# Altium footprint library Connectors.PcbLib: 63 footprints (part 2 of 4)
Each footprint in its own frame and in the unit in brackets; x right, y up, seen from the top. Pads: shape width x height; smd on the part's side, far side on the other; paste and mask are expansions set on the pad; w line width, h text height; cw(c..) or ccw(c..) is an arc to the next point about the centre after c.
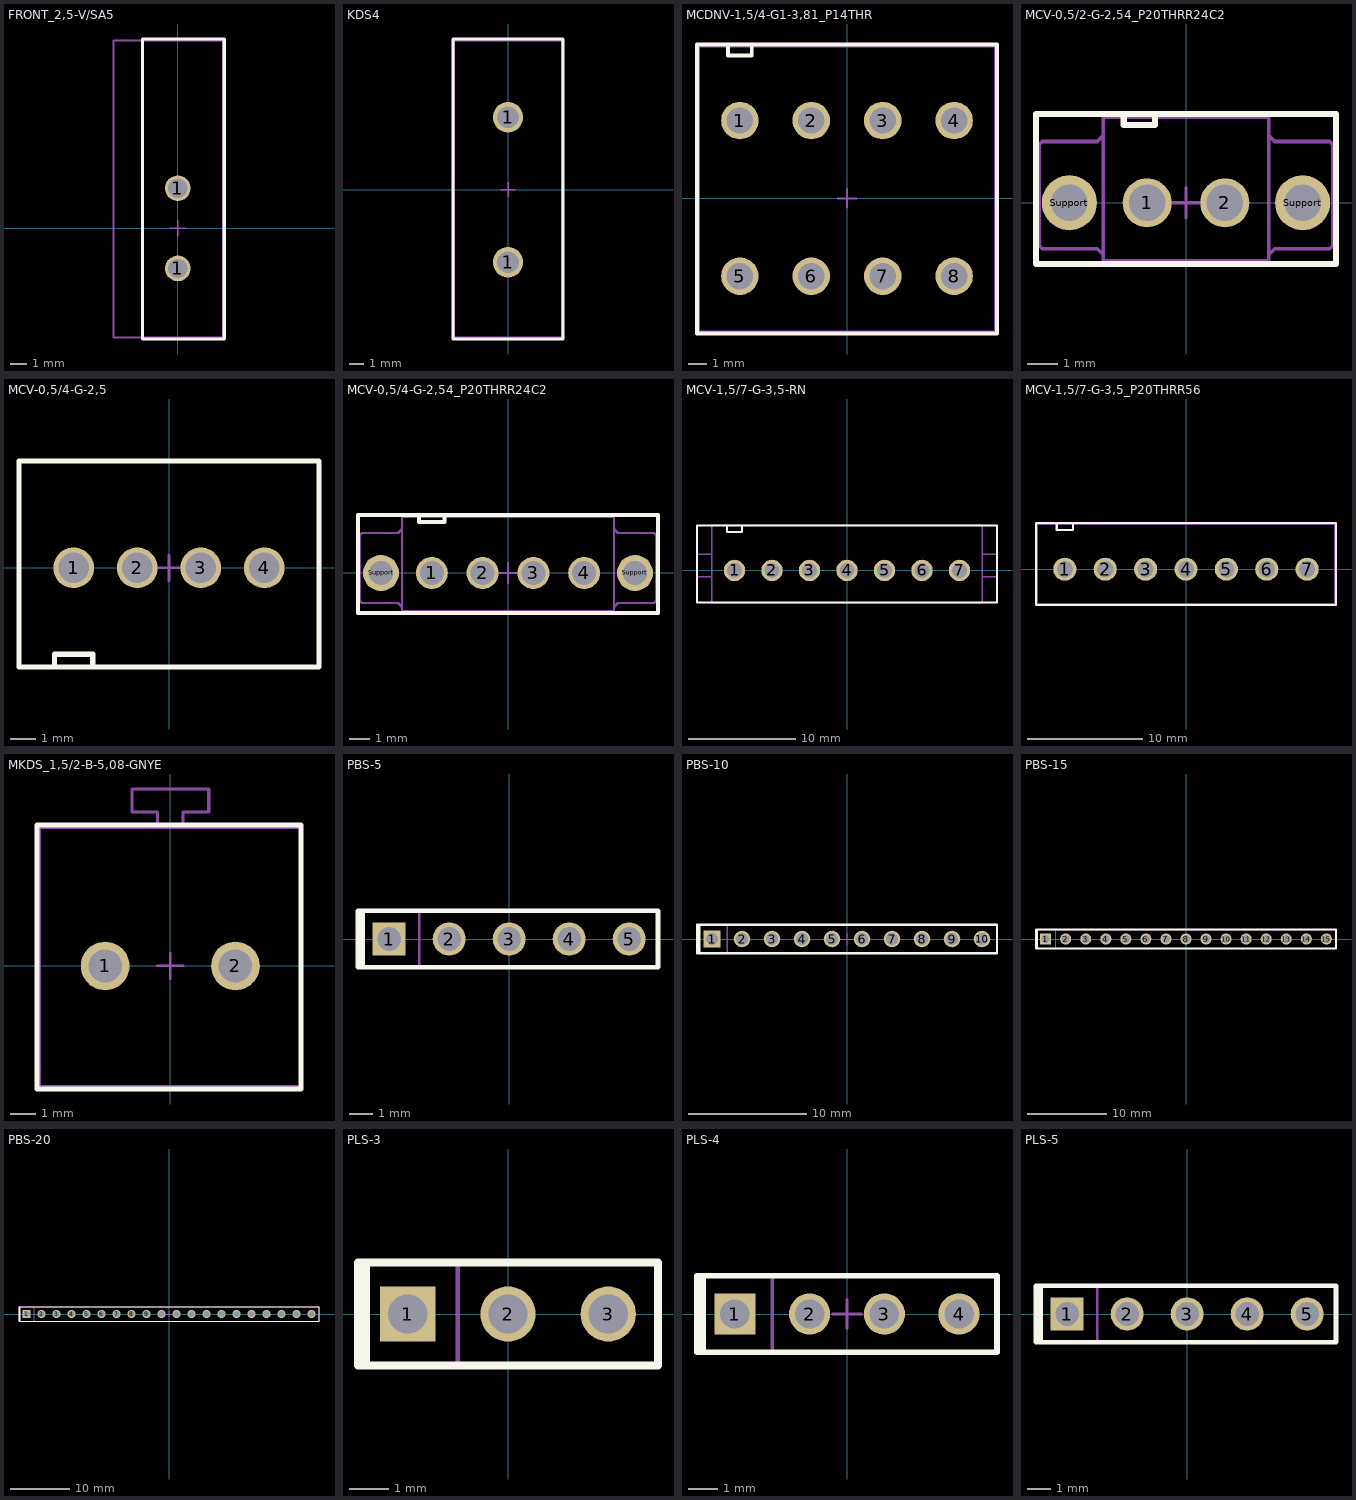
[diagram p1: the footprints below, top view; thin cyan lines are the x and y axes]

## FRONT_2,5-V/SA5 [mm] "FRONT 2,5-V/SA 5, 1 pins, Vendor Phoenix Contact, Code ¹1700037"
height 2.5
pads (2):
  round 1.6 hole 1.2 mask+0.1: 1(0,-2.5) 1(0,2.5)
Top Overlay:
  lines w0.2: -2.2,-6.9 -2.2,11.8 2.9,11.8 2.9,-6.9 -2.2,-6.9
ReperDotTop:
  lines w0.1: -0.5,0 0.5,0 ; 0,-0.5 0,0.5
AssemblyOutlineTop:
  lines w0.12: -4,-6.8 -4,11.7 2.8,11.7 2.8,-6.8 -4,-6.8
  text "'.Designator'" at 0,0 h2.5
3D body "pxc_1700037_03_FRONT-2-5-V-SA-5_3D.stp": height 20.1, standoff -2.9, extent -4,-6.775 2.8,11.725

## KDS4 [mm] "KDS 4, 1 pins, Vendor Phoenix Contact, Code ¹1780507"
height 2.5
pads (2):
  round 2.1 hole 1.5 mask+0.1: 1(0,-5) 1(0,5)
Top Overlay:
  lines w0.2: -3.8,-10.3 -3.8,10.4 3.8,10.4 3.8,-10.3 -3.8,-10.3
ReperDotTop:
  lines w0.1: -0.5,0 0.5,0 ; 0,-0.5 0,0.5
AssemblyOutlineTop:
  lines w0.12: -3.7,-10.2 -3.7,10.3 3.7,10.3 3.7,-10.2 -3.7,-10.2
  text "'.Designator'" at 0,0 h2.5
3D body "pxc_1780507_01_KDS-4_3D.stp": height 18.12, standoff -4.88, extent -4.3,-10.3 3.77,10.3

## MCDNV-1,5/4-G1-3,81_P14THR [mm] "MCDNV-1,5/4-G1-3,81, 8 pin, Pitch 3.81mm, Vendor Phoenix Contact, Code ¹1750122"
height 2.5
pads (8):
  round 2 hole 1.4 unplated mask+0.1: 1(-5.715,4.15) 2(-1.905,4.15) 3(1.905,4.15) 4(5.715,4.15) 5(-5.715,-4.15) 6(-1.905,-4.15) 7(1.905,-4.15) 8(5.715,-4.15)
Top Overlay:
  lines w0.2: -6.35,8.2 -6.35,7.62 -5.08,7.62 -5.08,8.2 ; -8,-7.2 8,-7.2 8,8.2 -8,8.2 -8,-7.2
ReperDotTop:
  lines w0.1: -0.5,0 0.5,0 ; 0,-0.5 0,0.5
AssemblyOutlineTop:
  lines w0.12: -7.9,-7.1 7.9,-7.1 7.9,8.1 -7.9,8.1 -7.9,-7.1
  text "'.Designator'" at 0,0 h2.5
3D body "pxc_1750122_01_MCDNV-1-5-4-G1-3-81-P14THR_3D.stp": height 13.42, standoff -1.28, extent -7.915,-7.1 7.915,8.1

## MCV-0,5/2-G-2,54_P20THRR24C2 [mm] "MCV-0,5/2-G-2,54, 2 pins, Pitch 2.54mm(0.1inch), Vendor Phoenix Contact, Code ¹1706169"
height 2.5
pads (4):
  round 1.6 hole 1.2 mask+0.1: 1(-1.27,0) 2(1.27,0)
  round 1.8 hole 1.2 mask+0.1: Support(-3.81,0) Support(3.81,0)
Top Overlay:
  lines w0.2: -2.032,2.9 -2.032,2.54 -1.016,2.54 -1.016,2.9 ; -4.9,-2 4.9,-2 4.9,2.9 -4.9,2.9 -4.9,-2
ReperDotTop:
  lines w0.1: -0.5,0 0.5,0 ; 0,-0.5 0,0.5
AssemblyOutlineTop:
  lines w0.12: -2.7,-1.7 -2.9,-1.5 -4.7,-1.5 -4.8,-1.4 -4.8,1.9 -4.7,2 -2.9,2 -2.7,2.2 ; 2.7,-1.7 2.9,-1.5 4.7,-1.5 4.8,-1.4 4.8,1.9 4.7,2 2.9,2 2.7,2.2 ; -2.7,-1.9 -2.7,2.8 2.7,2.8 2.7,-1.9 -2.7,-1.9
  text "'.Designator'" at 0,0 h2.5
3D body "pxc_1706169_00_MCV-0-5-2-G-2-54-P20THRR24C2_3D.stp": height 7.2, standoff -1.9, extent -4.84,-1.975 4.83,2.875

## MCV-0,5/4-G-2,5 [mm] "MCV-0,5/4-G-2,5, 4 pins, Pitch 2.5mm, Vendor Phoenix Contact, Code ¹1881574"
height 2.5
pads (4):
  round 1.6 hole 1.2 mask+0.1: 1(-3.75,0) 2(-1.25,0) 3(1.25,0) 4(3.75,0)
Top Overlay:
  lines w0.2: -4.5,-3.9 -4.5,-3.4 -3,-3.4 -3,-3.9 ; -5.9,-3.9 5.9,-3.9 5.9,4.2 -5.9,4.2 -5.9,-3.9
ReperDotTop:
  lines w0.1: -0.5,0 0.5,0 ; 0,-0.5 0,0.5
AssemblyOutlineTop:
  lines w0.12: -5.9,-3.9 -5.9,4.2 5.9,4.2 5.9,-3.9 -5.9,-3.9
  text "'.Designator'" at 0,0 h2.5
3D body "pxc_1881574_00_MCV-0-5-4-G-2-5_3D.stp": height 10.15, standoff -3.45, extent -5.95,-3.9 5.95,4.2

## MCV-0,5/4-G-2,54_P20THRR24C2 [mm] "MCV-0,5/4-G-2,54, 4 pins, Pitch 2.54mm(0.1inch), Vendor Phoenix Contact, Code ¹1706166"
height 2.5
pads (6):
  round 1.6 hole 1.2 mask+0.1: 1(-3.81,0) 2(-1.27,0) 3(1.27,0) 4(3.81,0)
  round 1.8 hole 1.2 mask+0.1: Support(-6.35,0) Support(6.35,0)
Top Overlay:
  lines w0.2: -4.445,2.9 -4.445,2.54 -3.175,2.54 -3.175,2.9 ; -7.5,-2 -7.5,2.9 7.5,2.9 7.5,-2 -7.5,-2
ReperDotTop:
  lines w0.1: -0.5,0 0.5,0 ; 0,-0.5 0,0.5
AssemblyOutlineTop:
  lines w0.12: -5.3,-1.7 -5.5,-1.5 -7.3,-1.5 -7.4,-1.4 -7.4,1.9 -7.3,2 -5.5,2 -5.3,2.2 ; 5.3,-1.7 5.5,-1.5 7.3,-1.5 7.4,-1.4 7.4,1.9 7.3,2 5.5,2 5.3,2.2 ; -5.3,-1.9 5.3,-1.9 5.3,2.8 -5.3,2.8 -5.3,-1.9
  text "'.Designator'" at 0,0 h2.5
3D body "pxc_1706166_00_MCV-0-5-4-G-2-54-P20THRR24C2_3D.stp": height 7.1, standoff -2, extent -7.375,-1.975 7.375,2.875

## MCV-1,5/7-G-3,5-RN [mm] "MCV 1.5/ 7 G 3,5, 7 pins, Pitch 3.5mm, Vendor Phoenix Contact, Code ¹1731536, Reply Part ¹1952076"
height 2.5
pads (7):
  round 2 hole 1.4 unplated mask+0.1: 1(-10.5,0) 2(-7,0) 3(-3.5,0) 4(0,0) 5(3.5,0) 6(7,0) 7(10.5,0)
Top Overlay:
  lines w0.2: -11.2,4.2 -11.2,3.6 -9.8,3.6 -9.8,4.2 ; -14,-3 -14,4.2 14,4.2 14,-3 -14,-3
ReperDotTop:
  lines w0.1: -0.5,0 0.5,0 ; 0,-0.5 0,0.5
AssemblyOutlineTop:
  lines w0.12: -12.6,-0.6 -14,-0.6 -14,1.5 -12.6,1.5 ; 12.6,-0.6 14,-0.6 14,1.5 12.6,1.5 ; -12.6,-3 12.6,-3 12.6,4.2 -12.6,4.2 -12.6,-3
  text "'.Designator'" at 0,0 h2.5
3D body "pxc_1731536_03_MCV-1-5-7-G-3-5-RN_3D.stp": height 9.31, standoff -3.29, extent -14.05,-3 14.05,4.25

## MCV-1,5/7-G-3,5_P20THRR56 [mm] "MCV 1.5/ 7 G 3.5, 7 pins, Pitch 3.5mm, Vendor Phoenix Contact, Code ¹1780985, Reply Part ¹1952319"
height 2.5
pads (7):
  round 2 hole 1.4 unplated mask+0.1: 1(-10.5,0) 2(-7,0) 3(-3.5,0) 4(0,0) 5(3.5,0) 6(7,0) 7(10.5,0)
Top Overlay:
  lines w0.2: -11.2,4 -11.2,3.4 -9.8,3.4 -9.8,4 ; -13,-3.1 13,-3.1 13,4 -13,4 -13,-3.1
ReperDotTop:
  lines w0.1: -0.5,0 0.5,0 ; 0,-0.5 0,0.5
AssemblyOutlineTop:
  lines w0.12: -12.9,-3 -12.9,3.9 12.9,3.9 12.9,-3 -12.9,-3
  text "'.Designator'" at 0,0 h2.5
3D body "pxc_1843651_03_MCV-1-5-7-G-3-5_3D.stp": height 9.3, standoff -3.3, extent -12.95,-3 12.95,4.25

## MKDS_1,5/2-B-5,08-GNYE [mm] "MKDS 1.5/ 2-B-5.08 GNYE, 2 pins, Vendor Phoenix Contact, Code ¹1706358"
height 2.5
pads (2):
  round 1.9 hole 1.3 mask+0.1: 1(-2.54,0) 2(2.54,0)
Top Overlay:
  lines w0.2: -5.2,-4.8 -5.2,5.5 5.1,5.5 5.1,-4.8 -5.2,-4.8
ReperDotTop:
  lines w0.1: -0.5,0 0.5,0 ; 0,-0.5 0,0.5
AssemblyOutlineTop:
  lines w0.12: -0.5,5.4 -0.5,6 -1.5,6 -1.5,6.9 0,6.9 1.5,6.9 1.5,6 0.5,6 0.5,5.4 ; -5.1,-4.7 -5.1,5.4 5.1,5.4 5.1,-4.7 -5.1,-4.7
  text "'.Designator'" at 0,0 h2.5
3D body "1706358_02.stp": height 14.3, standoff -3.4, extent -5.665,-4.65 5.065,6.95

## PBS-5 [mm] "PBS Package, 5 pins, Pitch 2.54mm (0.1inch)"
height 2.5
pads (5):
  rect 1.4x1.4 hole 1 unplated mask+0.1: 1(-5.08,0)
  round 1.4 hole 1 unplated mask+0.1: 2(-2.54,0) 3(0,0) 4(2.54,0) 5(5.08,0)
Top Overlay:
  lines w0.2: -6.2,-1.2 -6.2,1.2 ; -6.4,-1.2 6.3,-1.2 6.3,1.2 -6.4,1.2 -6.4,-1.2
ReperDotTop:
  lines w0.1: -0.5,0 0.5,0 ; 0,-0.5 0,0.5
AssemblyOutlineTop:
  lines w0.12: -3.81,-1.2 -3.81,1.2 ; -6.3,-1.2 -6.3,1.2 6.3,1.2 6.3,-1.2 -6.3,-1.2
  text "'.Designator'" at 0,0 h2.5
3D body "User Library-PBS-05.step": height 8.45, standoff -3.15, extent -6.35,-1.27 6.35,1.27

## PBS-10 [mm] "PBS Package, 10 pins, Pitch 2.54mm (0.1inch)"
height 2.5
pads (10):
  rect 1.4x1.4 hole 1 unplated mask+0.1: 1(-11.43,0)
  round 1.4 hole 1 unplated mask+0.1: 2(-8.89,0) 3(-6.35,0) 4(-3.81,0) 5(-1.27,0) 6(1.27,0) 7(3.81,0) 8(6.35,0) 9(8.89,0) 10(11.43,0)
Top Overlay:
  lines w0.2: -12.5,-1.2 -12.5,1.2 ; -12.7,-1.2 -12.7,1.2 12.7,1.2 12.7,-1.2 -12.7,-1.2
ReperDotTop:
  lines w0.1: -0.5,0 0.5,0 ; 0,-0.5 0,0.5
AssemblyOutlineTop:
  lines w0.12: -10.16,-1.2 -10.16,1.2 ; -12.7,-1.2 12.7,-1.2 12.7,1.2 -12.7,1.2 -12.7,-1.2
  text "'.Designator'" at 0,0 h2.5
3D body "User Library-PBS-05.step": height 8.45, standoff -3.15, extent 0,-1.27 12.7,1.27
3D body "User Library-PBS-05.step": height 8.45, standoff -3.15, extent -12.7,-1.27 0,1.27

## PBS-15 [mm] "PBS Package, 15pins, Pitch 2.54mm (0.1inch)"
height 2.5
pads (15):
  rect 1.4x1.4 hole 1 unplated mask+0.1: 1(-17.78,0)
  round 1.4 hole 1 unplated mask+0.1: 2(-15.24,0) 3(-12.7,0) 4(-10.16,0) 5(-7.62,0) 6(-5.08,0) 7(-2.54,0) 8(0,0) 9(2.54,0) 10(5.08,0) 11(7.62,0) 12(10.16,0) 13(12.7,0) 14(15.24,0) 15(17.78,0)
Top Overlay:
  lines w0.2: -18.82,-1.2 -18.82,1.2 ; -19,-1.2 -19,1.2 19,1.2 19,-1.2 -19,-1.2
ReperDotTop:
  lines w0.1: -0.5,0 0.5,0 ; 0,-0.5 0,0.5
AssemblyOutlineTop:
  lines w0.12: -16.51,-1.2 -16.51,1.2 ; -19,-1.2 19,-1.2 19,1.2 -19,1.2 -19,-1.2
  text "'.Designator'" at 0,0 h2.5
3D body "User Library-PBS-05.step": height 8.45, standoff -3.15, extent -6.35,-1.27 6.35,1.27
3D body "User Library-PBS-05.step": height 8.45, standoff -3.15, extent -19.05,-1.27 -6.35,1.27
3D body "User Library-PBS-05.step": height 8.45, standoff -3.15, extent 6.35,-1.27 19.05,1.27

## PBS-20 [mm] "PBS Package, 20 pins, Pitch 2.54mm (0.1inch)"
height 2.5
pads (20):
  rect 1.4x1.4 hole 1 unplated mask+0.1: 1(-24.13,0)
  round 1.4 hole 1 unplated mask+0.1: 2(-21.59,0) 3(-19.05,0) 4(-16.51,0) 5(-13.97,0) 6(-11.43,0) 7(-8.89,0) 8(-6.35,0) 9(-3.81,0) 10(-1.27,0) 11(1.27,0) 12(3.81,0) 13(6.35,0) 14(8.89,0) 15(11.43,0) 16(13.97,0) 17(16.51,0) 18(19.05,0) 19(21.59,0) 20(24.13,0)
Top Overlay:
  lines w0.2: -25.2,-1.2 -25.2,1.2 ; -25.4,-1.2 25.4,-1.2 25.4,1.2 -25.4,1.2 -25.4,-1.2
ReperDotTop:
  lines w0.1: -0.5,0 0.5,0 ; 0,-0.5 0,0.5
AssemblyOutlineTop:
  lines w0.12: -22.86,-1.2 -22.86,1.2 ; -25.4,-1.2 -25.4,1.2 25.4,1.2 25.4,-1.2 -25.4,-1.2
  text "'.Designator'" at 0,0 h2.5
3D body "User Library-PBS-05.step": height 8.45, standoff -3.15, extent 12.7,-1.27 25.4,1.27
3D body "User Library-PBS-05.step": height 8.45, standoff -3.15, extent 0,-1.27 12.7,1.27
3D body "User Library-PBS-05.step": height 8.45, standoff -3.15, extent -25.4,-1.27 -12.7,1.27
3D body "User Library-PBS-05.step": height 8.45, standoff -3.15, extent -12.7,-1.27 0,1.27

## PLS-3 [mm] "PLS Connector, 3 pin, Pitch 2.54mm (0.1inch)"
height 2.5
pads (3):
  rect 1.4x1.4 hole 1: 1(-2.54,0)
  round 1.4 hole 1: 2(0,0) 3(2.54,0)
Top Overlay:
  lines w0.2: -3.6,-1.3 -3.6,1.3 ; -3.8,-1.3 3.8,-1.3 3.8,1.3 -3.8,1.3 -3.8,-1.3
ReperDotTop:
  lines w0.1: -0.5,0 0.5,0 ; 0,-0.5 0,0.5
AssemblyOutlineTop:
  lines w0.12: -1.27,-1.3 -1.27,1.3 ; -3.8,-1.3 3.8,-1.3 3.8,1.3 -3.8,1.3 -3.8,-1.3
  text "'.Designator'" at 0,0 h2.5
3D body "User Library-PLS-3.step": height 8.54, standoff -3, extent -3.81,-1.275 3.81,1.265

## PLS-4 [mm] "PLS Connector, 4 pin, Pitch 2.54mm (0.1inch)"
height 2.5
pads (4):
  rect 1.4x1.4 hole 1: 1(-3.81,0)
  round 1.4 hole 1: 2(-1.27,0) 3(1.27,0) 4(3.81,0)
Top Overlay:
  lines w0.2: -4.9,-1.3 -4.9,1.3 ; -5.1,-1.3 5.1,-1.3 5.1,1.3 -5.1,1.3 -5.1,-1.3
ReperDotTop:
  lines w0.1: -0.5,0 0.5,0 ; 0,-0.5 0,0.5
AssemblyOutlineTop:
  lines w0.12: -2.54,-1.3 -2.54,1.3 ; -5.1,-1.3 5.1,-1.3 5.1,1.3 -5.1,1.3 -5.1,-1.3
  text "'.Designator'" at 0,0 h2.5
3D body "User Library-PLS-2.step": height 8.59, standoff -2.95, extent -5.08,-1.27 0,1.27
3D body "User Library-PLS-2.step": height 8.59, standoff -2.95, extent 0,-1.27 5.08,1.27

## PLS-5 [mm] "PLS Package, 5 pins, Pitch 2.54mm (0.1inch)"
height 2.5
pads (5):
  rect 1.4x1.4 hole 1 unplated mask+0.1: 1(-5.08,0)
  round 1.4 hole 1 unplated mask+0.1: 2(-2.54,0) 3(0,0) 4(2.54,0) 5(5.08,0)
Top Overlay:
  lines w0.2: -6.2,-1.2 -6.2,1.2 ; -6.4,-1.2 6.3,-1.2 6.3,1.2 -6.4,1.2 -6.4,-1.2
ReperDotTop:
  lines w0.1: -0.5,0 0.5,0 ; 0,-0.5 0,0.5
AssemblyOutlineTop:
  lines w0.12: -3.81,-1.2 -3.81,1.2 ; -6.3,-1.2 -6.3,1.2 6.3,1.2 6.3,-1.2 -6.3,-1.2
  text "'.Designator'" at 0,0 h2.5
3D body "User Library-PLS-5.step": height 8.59, standoff -2.95, extent -6.35,-1.27 6.35,1.27